# Altium integrated library Integrated_jp.IntLib: 316 symbols (part 1 of 3) (continued)
## CONN_PWR_JACK_2.5X5.5MM (continued)
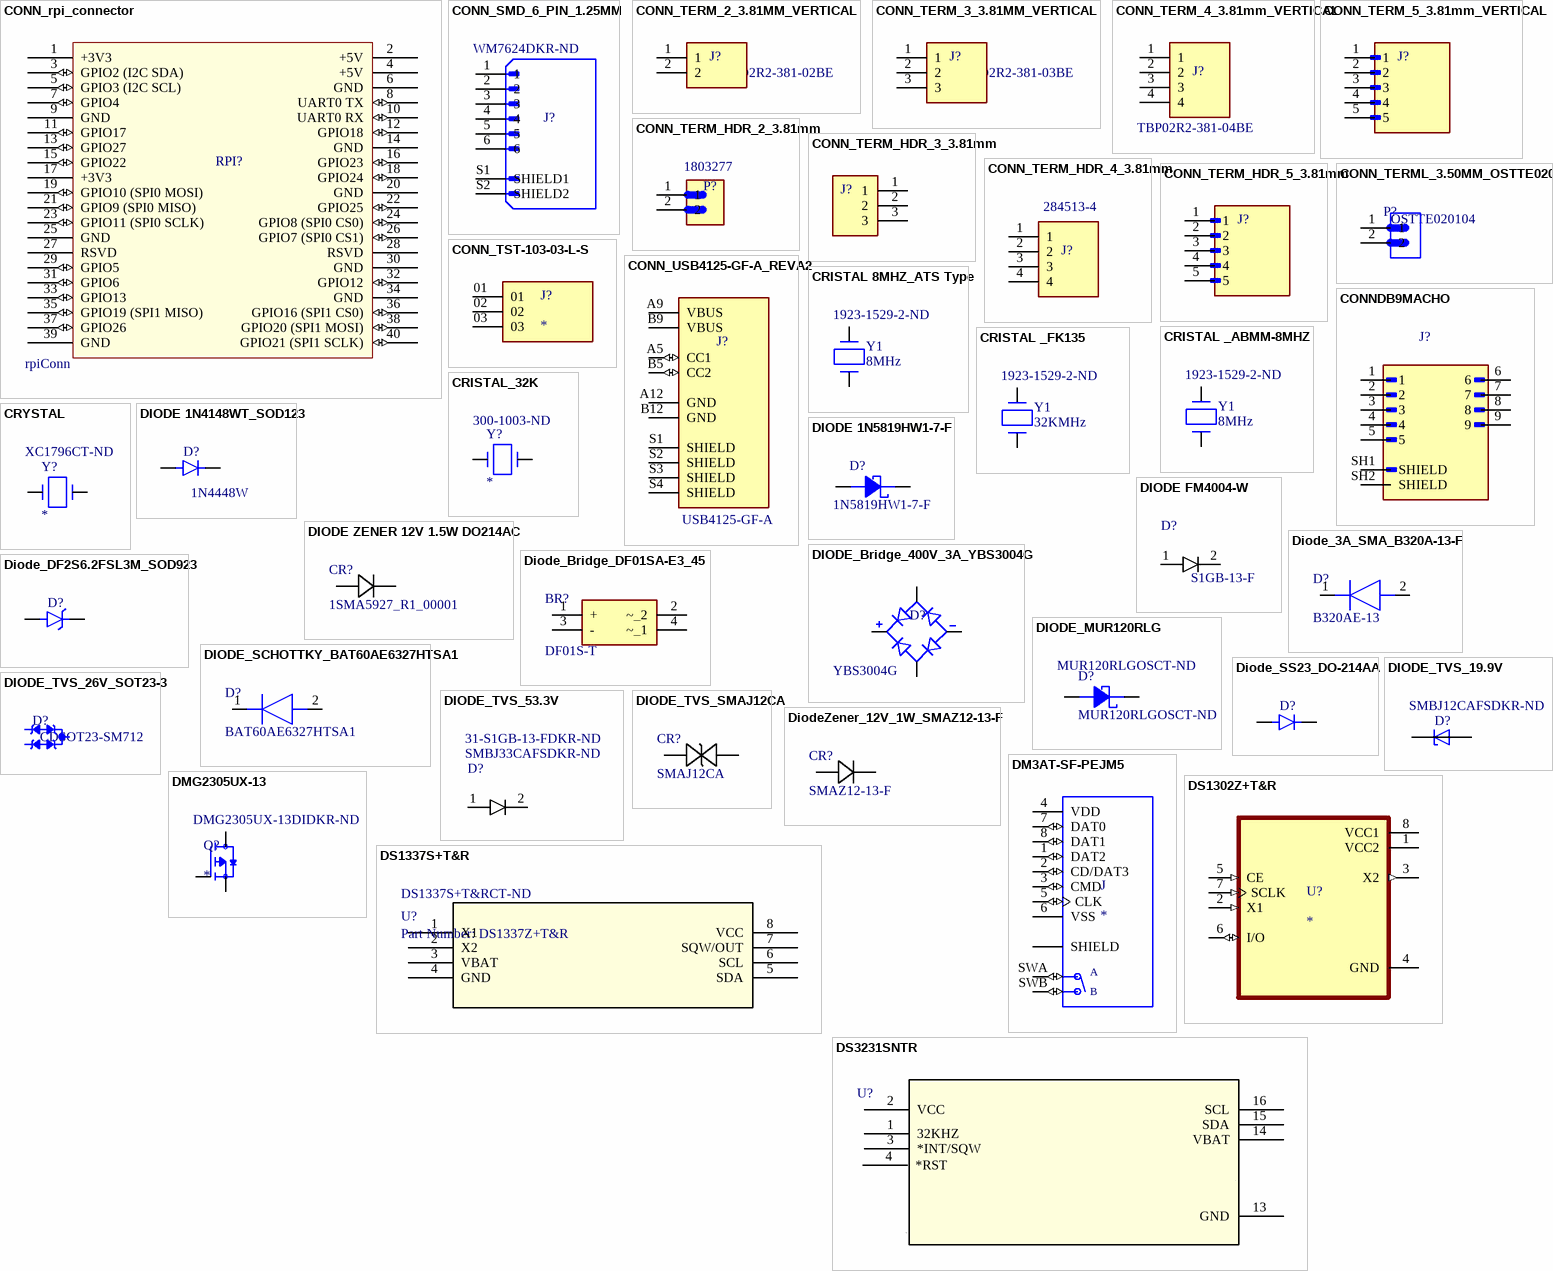
[diagram p2: symbols CONN_rpi_connector to DS3231SNTR]

## CONN_rpi_connector
designator RPI?, comment value rpiConn  (hidden comment: ESQ-120-14-T-D)
40 Position Elevated Socket Connector 0.100" (2.54mm) Through Hole Tin; Digi_Key_Part_Number: SAM11108-ND; Link: https://www.digikey.com/en/products/detail/samtec-inc/ESQ-120-14-T-D/6693975; Price: 5,84; ComponentLink1Description: CONN SOCKET 40POS 0.1 TIN PCB; ComponentLink1URL: https://www.digikey.com/en/products/detail/samtec-inc/ESQ-120-14-T-D/6693975
footprint SAMTEC_ESQ-120-XX-X-D-XX
pins: 1 +3V3 (power), 2 +5V (power), 3 GPIO2 (I2C SDA) (io), 4 +5V (power), 5 GPIO3 (I2C SCL) (io), 6 GND (power), 7 GPIO4 (io), 8 UART0 TX (io), 9 GND (power), 10 UART0 RX (io), 11 GPIO17 (io), 12 GPIO18 (io), 13 GPIO27 (io), 14 GND (power), 15 GPIO22 (io), 16 GPIO23 (io), 17 +3V3 (power), 18 GPIO24 (io), 19 GPIO10 (SPI0 MOSI) (io), 20 GND (power), 21 GPIO9 (SPI0 MISO) (io), 22 GPIO25 (io), 23 GPIO11 (SPI0 SCLK) (io), 24 GPIO8 (SPI0 CS0) (io), 25 GND (power), 26 GPIO7 (SPI0 CS1) (io), 27 RSVD, 28 RSVD, 29 GPIO5 (io), 30 GND (power), 31 GPIO6 (io), 32 GPIO12 (io), 33 GPIO13 (io), 34 GND, 35 GPIO19 (SPI1 MISO) (io), 36 GPIO16 (SPI1 CS0) (io), 37 GPIO26 (io), 38 GPIO20 (SPI1 MOSI) (io), 39 GND (power), 40 GPIO21 (SPI1 SCLK) (io)

## CONN_SMD_6_PIN_1.25MM
designator J?, comment Supplier Part Number 1: WM7624DKR-ND  (hidden comment: 532610671)
Connector Header Surface Mount, Right Angle 6 position 0.049 (1.25mm); MF: Molex; Check_prices: https://www.snapeda.com/parts/532610671/Molex/view-part/?ref=eda; Value: *; Purchase-URL: https://pricing.snapeda.com/search/part/532610671/?ref=eda; Digi-Key_Part_Number: WM7624TR-ND; SnapEDA_Link: https://www.snapeda.com/parts/532610671/Molex/view-part/?ref=snap; Package: None; MP: 532610671; Supplier 1: Digi-Key; ComponentLink1Description: CONN HEADER SMD R/A 6POS 1.25MM; ComponentLink1URL: https://www.digikey.com/es/products/detail/0532610671/WM7624DKR-ND/1846792?utm_campaign=buynow&utm_medium=aggregator&curr=usd&utm_source=octopart; Link: https://www.digikey.com/es/products/detail/0532610671/WM7624DKR-ND/1846792?utm_campaign=buynow&utm_medium=aggregator&curr=usd&utm_source=octopart
footprint MOLEX_532610671
pins: 1, 2, 3, 4, 5, 6, S1 SHIELD1, S2 SHIELD2

## CONN_TERM_2_3.81MM_VERTICAL
designator J?, comment TBP02R2-381-02BE
2 Bloque de terminales de posición Cabecera, clavija macho, protegida (4 lados) 0.150" (3.81mm) Vertical Orificio pasante; Digi_Key_Part_Number: 102-6492-ND; Price: 0,61; ComponentLink1Description: TERMINAL BLOCK, PLUGGABLE, 3.81,; ComponentLink1URL: https://www.digikey.com/es/products/detail/same-sky-formerly-cui-devices/TBP02R2-381-02BE/10238469; Link: https://www.digikey.com/es/products/detail/same-sky-formerly-cui-devices/TBP02R2-381-02BE/10238469; LCSC Part: C8396; Price JLCPCB: 0,02; Value: TBP02R2-381-02BE
footprint SHDR2W80P0X381_1X2_841X720X920P
pins: 1, 2

## CONN_TERM_3_3.81MM_VERTICAL
designator J?, comment TBP02R2-381-03BE
3 Bloque de terminales de posición Cabecera, clavija macho, protegida (4 lados) 0.150" (3.81mm) Vertical Orificio pasante; Digi_Key_Part_Number: 102-6493-ND; Price: 0,74; ComponentLink1Description: TERMINAL BLOCK, PLUGGABLE, 3.81,VERTICAL; ComponentLink1URL: https://www.digikey.com/es/products/detail/same-sky-formerly-cui-devices/TBP02R2-381-03BE/10238470; Link: https://www.digikey.com/es/products/detail/same-sky-formerly-cui-devices/TBP02R2-381-03BE/10238470; LCSC Part: C387814; Price JLCPCB: 0,04; Value: TBP02R2-381-03BE
footprint CUI_TBP02R2-381-03BE
pins: 1, 2, 3

## CONN_TERM_4_3.81mm_VERTICAL
designator J?, comment TBP02R2-381-04BE
4 Bloque de terminales de posición Cabecera, clavija macho, protegida (4 lados) 0.150" (3.81mm) Vertical Orificio pasante; Digi_Key_Part_Number: 102-6494-ND; Price: 0.82; ComponentLink1Description: TERMINAL BLOCK, PLUGGABLE, 3.81,; ComponentLink1URL: https://www.digikey.com/es/products/detail/same-sky-formerly-cui-devices/TBP02R2-381-04BE/10238471; Link: https://www.digikey.com/es/products/detail/same-sky-formerly-cui-devices/TBP02R2-381-04BE/10238471; LCSC Part: C8410; Price JLCPCB: 0,05; Value: TBP02R2-381-04BE
footprint CUI_TBP02R2-381-04BE
pins: 1, 2, 3, 4

## CONN_TERM_5_3.81mm_VERTICAL
designator J?, comment 1803455  (value not drawn)
5 Bloque de terminales de posición Cabecera, clavija macho, protegida (4 lados) 0.150" (3.81mm) Vertical Orificio pasante; Digi_Key_Part_Number: 277-1224-ND; Price: 2,38; Link: https://www.digikey.com/es/products/detail/phoenix-contact/1803455/260592; LCSC Part: C8391; Price JLCPCB: 0,06; ComponentLink1Description: TERM BLOCK HDR 5POS 3.81MM; ComponentLink1URL: https://www.digikey.com/es/products/detail/phoenix-contact/1803455/260592
footprint PHOENIX_1803455
pins: 1, 2, 3, 4, 5

## CONN_TERM_HDR_2_3.81mm
designator P?, comment value 1803277  (hidden comment: 277-1206-ND)
2 Position Terminal Block Header, Male Pins, Shrouded (4 Side) 0.150" (3.81mm) 90°, Right Angle Through Hole; Link: https://www.digikey.com/en/products/detail/phoenix-contact/1803277/260574; ComponentLink1Description: TERM BLOCK HDR 2POS 90DEG 3.81MM; ComponentLink1URL: https://www.digikey.com/es/products/detail/phoenix-contact/1803277/260574?s=N4IgTCBcDa4OxwLQEYwAYBsiByAREAugL5A; Digi_Key_Part_Number: 277-1206-ND; Price: 0,59; LCSC Part: C8387; Price JLCPCB: 0,2
footprint PHOENIX_1803277
pins: 1, 2

## CONN_TERM_HDR_3_3.81mm
designator J?, comment 284513-3  (value not drawn)
3 Bloque de terminales de posición Cabecera, clavija macho, protegida (4 lados) 0.150" (3.81mm) 90°, ángulo recto Orificio pasante; Digi_Key_Part_Number: A98402-ND; Value: 284513-3; Price: 1,31; Link: https://www.digikey.com/en/products/detail/te-connectivity-amp-connectors/284513-3/1153286; ComponentLink1Description: TERM BLOCK HDR 3POS 90DEG 3.81MM; ComponentLink1URL: https://www.digikey.com/es/products/detail/te-connectivity-amp-connectors/284513-3/1153286?s=N4IgTCBcDaIIIE4AcAWADGAtAOQCIgF0BfIA; LCSC Part: C387816; Price JLCPCB: 0,05
footprint TE_284513-3
pins: 1, 2, 3

## CONN_TERM_HDR_4_3.81mm
designator J?, comment 284513-4
4 Bloque de terminales de posición Cabecera, clavija macho, protegida (4 lados) 0.150" (3.81mm) 90°, ángulo recto Orificio pasante; Digi_Key_Part_Number: A98403-ND; Price: 0,79; Link: https://www.digikey.com/en/products/detail/te-connectivity-amp-connectors/284513-4/1136751; ComponentLink1Description: TERM BLOCK HDR 4POS 90DEG 3.81MM; ComponentLink1URL: https://www.digikey.com/es/products/detail/te-connectivity-amp-connectors/284513-4/1136751?s=N4IgTCBcDaIIIE4AcAWADAZgLQDkAiIAugL5A; ComponentLink2Description: TERM BLOCK HDR 4POS 90DEG 3.81MM; ComponentLink2URL: https://www.digikey.com/es/products/detail/te-connectivity-amp-connectors/284513-4/1136751; Price JLCPCB: 0,05; LCSC Part: C7245; Value: 284513-4
footprint TE_284513-4
pins: 1, 2, 3, 4

## CONN_TERM_HDR_5_3.81mm
designator J?, comment 1803303  (value not drawn)
5 Bloque de terminales de posición Cabecera, clavija macho, protegida (4 lados) 0.150" (3.81mm) 90°, ángulo recto Orificio pasante; Digi_Key_Part_Number: 277-1209-ND; Price: 2,38; Link: https://www.digikey.com/es/products/detail/phoenix-contact/1803303/260577; ComponentLink1Description: TERM BLOCK HDR 5POS 3.81MM; ComponentLink1URL: https://www.digikey.com/es/products/detail/phoenix-contact/1803303/260577; LCSC Part: C8395; Price JLCPCB: 0,06
footprint CONN_1803303_PXC
pins: 1, 2, 3, 4, 5

## CONN_TERML_3.50MM_OSTTE020104
designator P?, comment OSTTE020104
2 Bloques de terminales - Cable a placa Horizontal con placa 0.138" (3.50mm) Orificio pasante; Link: https://www.digikey.com/product-detail/en/on-shore-technology-inc/OSTTE020104/ED2740-ND/2351816?utm_source=snapeda&utm_medium=aggregator&utm_campaign=symbol; Price: 0,79; Digi-Key_Part_Number: ED2740-ND; ComponentLink1Description: TERM BLK 2POS SIDE ENT 3.5MM PCB; ComponentLink1URL: https://www.digikey.com/es/products/detail/on-shore-technology-inc/OSTTE020104/2351816; Value: OSTTE020104
footprint OST_OSTTE020104
pins: 1, 2

## CONN_TST-103-03-L-S
designator J?
Cabezal de conector Orificio pasante 3 posiciones 0.100" (2.54mm); MP: TST-103-03-L-S; Package: None; Price: None; Value: *; Availability: Unavailable; ComponentLink1Description: CONN HEADER VERT 3POS 2.54MM; ComponentLink1URL: https://www.digikey.com/es/products/detail/samtec-inc/TST-103-03-L-S/9497032?s=N4IgTCBcDaICoGU4FoCMAGAzMryAyyCIAugL5A; Link: https://www.digikey.com/es/products/detail/samtec-inc/TST-103-03-L-S/9497032?s=N4IgTCBcDaICoGU4FoCMAGAzMryAyyCIAugL5A; Digi-Key_Part_Number: TST-103-03-L-S-ND
footprint SAMTEC_TST-103-03-L-S
pins: 01, 02, 03

## CONN_USB4125-GF-A_REVA2
designator J?, comment USB4125-GF-A
USB-C (USB TYPE-C) Receptacle Connector 24 (6+18 Dummy) Position Surface Mount, Right Angle; Through Hole; Digi_Key_Part_Number: 2073-USB4125-GF-ACT-ND; Link: https://www.digikey.com/en/products/detail/gct/USB4125-GF-A/13547388; Price: 0,80; ComponentLink1Description: CONN RCPT TYPE C 6P SMD RA; ComponentLink1URL: https://www.digikey.com/en/products/detail/gct/USB4125-GF-A/13547388; Value: USB4125-GF-A
footprint GCT_USB4125-GF-A_REVA2
pins: A5 CC1 (io), A9 VBUS (power), A12 GND (power), B5 CC2 (io), B9 VBUS (power), B12 GND (power), S1 SHIELD, S2 SHIELD, S3 SHIELD, S4 SHIELD

## CONNDB9MACHO
designator J?, comment AE10968-ND  (value not drawn)
9 Posiciones D-Sub Clavija de conexión, clavijas macho Conector; Value: A-DS 09 A/KG-T2S; Price: 0,83; Link: https://www.digikey.com/es/products/detail/assmann-wsw-components/A-DS-09-A-KG-T2S/1241804?s=N4IgTCBcDaIIIFECMAGAnANgBwFoByAIiALoC%2BQA; Digi_Key_Part_Number: AE10968-ND; LCSC Part: C9900006534; Mouser Part: *; Price JLCPCB: 0,1; ComponentLink1Description: CONN D-SUB PLUG 9POS R/A SOLDER; ComponentLink1URL: https://www.digikey.com/es/products/detail/assmann-wsw-components/A-DS-09-A-KG-T2S/1241804?s=N4IgTCBcDaIIIFECMAGAnANgBwFoByAIiALoC%2BQA
footprint ASSMANN_A-DS_09_A_KG-T2S
pins: 1, 2, 3, 4, 5, 6, 7, 8, 9, SH1 SHIELD, SH2 SHIELD

## CRISTAL 8MHZ_ATS Type
designator Y1, comment 8MHz  Supplier Part Number 1: 1923-1529-2-ND
ATS Type Crystal; ComponentLink1Description: LFXTAL036274REEL; ComponentLink1URL: https://www.digikey.com/es/products/detail/iqd-frequency-products/LFXTAL036274REEL/8633816; Supplier 1: Digi-Key
footprint OSC-ATS Type (ATS Type Crystal)
pins: 1, 2

## CRISTAL _ABMM-8MHZ
designator Y1, comment 8MHz  Supplier Part Number 1: 1923-1529-2-ND
8 MHz ±20ppm Cristales 18pF 4-SMD, sin conductor; ComponentLink1Description: LFXTAL036274REEL; ComponentLink1URL: https://www.digikey.com/es/products/detail/iqd-frequency-products/LFXTAL036274REEL/8633816; Supplier 1: Digi-Key
footprint OSC_ABMM-8.000MHZ-B2-T
pins: 1, 2

## CRISTAL _FK135
designator Y1, comment 32KMHz  Supplier Part Number 1: 1923-1529-2-ND
CRYSTAL 32.7680KHZ 12.5PF SMD; ComponentLink1Description: LFXTAL036274REEL; ComponentLink1URL: https://www.digikey.com/es/products/detail/iqd-frequency-products/LFXTAL036274REEL/8633816; Supplier 1: Digi-Key
footprint CRYSTAL_0805
pins: 1, 2

## CRISTAL_32K
designator Y?  Supplier Part Number 2: 300-1003-ND
Manufacturer: ECS International; Manufacturer Part Number: ECS-200-20-3X-EN-TR; Frequency: 20MHz; Frequency Tolerance: 30ppm; Load Capacitance: 20pF; ESR (Equivalent Series Resistance): 50R; Frequency Stability: 50ppm; Supplier 1: Digi-Key; Stock 1: 16745; Pricing 1: 1=0.53, 10=0.44, 50=0.396, 100=0.352, 500=0.3344, 1000=0.2816 (USD); Mount: Surface Mount; Min Operating Temperature: -40°C; Max Operating Temperature: 85°C; Package Quantity: 1; Packaging: Tape and Reel; Tolerance: 30ppm; Termination: SMD/SMT; Length: 0.276inch; Height: 0.091inch; Width: 0.161inch; Lead Free: Lead Free; Supplier 2: Digi-Key; Stock 2: 1865; Pricing 2: 1=1.04, 10=0.92, 50=0.86, 100=0.76, 500=0.72, 1000=0.6, 2500=0.58, 5000=0.56, 10000=0.54 (USD); Case/Package: Radial
footprint OSC-CH206-RA
pins: 1, 2

## CRYSTAL
designator Y?  Supplier Part Number 1: XC1796CT-ND
Manufacturer: ECS International; Manufacturer Part Number: ECS-200-20-3X-EN-TR; Frequency: 20MHz; Frequency Tolerance: 30ppm; Load Capacitance: 20pF; ESR (Equivalent Series Resistance): 50R; Frequency Stability: 50ppm; Supplier 1: Digi-Key; Stock 1: 16745; Pricing 1: 1=0.53, 10=0.44, 50=0.396, 100=0.352, 500=0.3344, 1000=0.2816 (USD); Mount: Surface Mount; Min Operating Temperature: -40°C; Max Operating Temperature: 85°C; Package Quantity: 1; Packaging: Tape and Reel; Tolerance: 30ppm; Termination: SMD/SMT; Length: 0.276inch; Height: 0.091inch; Width: 0.161inch; Lead Free: Lead Free; ComponentLink1URL: http://www.ecsxtal.com/store/pdf/CSM-3X.pdf?src-supplier=Digi-Key; ComponentLink1Description: http://www.ecsxtal.com/store/pdf/CSM-3X.pdf?src-supplier=Digi-Key; ComponentLink2Description: ABLS7M2-25.000MHZ-D2Y-T; ComponentLink2URL: https://www.digikey.com/es/products/detail/abracon-llc/ABLS7M2-25-000MHZ-D2Y-T/5135064
footprint XTAL
pins: 1, 2

## DIODE 1N4148WT_SOD123
designator D?, comment value 1N4448W  (hidden comment: 1N4448W-FDICT-ND)
Diodos 75 V 250mA Montaje en superficie SOD-123; Digi_Key_Part_Number: 1N4448W-FDICT-ND; Link: https://www.digikey.com/es/products/detail/micro-commercial-co/1N4448W-TP/789330; ComponentLink2Description: DIODE GEN PURP 75V 250MA SOD123; ComponentLink2URL: https://www.digikey.com/es/products/detail/micro-commercial-co/1N4448W-TP/789330?s=N4IgTCBcDaIIwDkAsKAcB1AKgBQLIGUBhTAWgQBEQBdAXyA; Price: 0,11; LCSC Part: C124191; Mouser Part: 621-1N4448W-F; Price JLCPCB: 0,02
footprint DIOMELF3414N
pins: A 2, C 1

## DIODE 1N5819HW1-7-F
designator D?, comment value 1N5819HW1-7-F  (hidden comment: 1N5819HW1-7-FDICT-ND)
Diode Super Barrier 40 V 1A Surface Mount SOD-123F; Manufacturer: Diodes; Manufacturer Part Number: 1N5819HW-7-F; Forward Voltage: 450mV; Max Power Dissipation: 450mW; Peak Reverse Current: 50uA; Element Configuration: Single; Max Repetitive Reverse Voltage (Vrrm): 40V; Max Forward Surge Current (Ifsm): 25A; Polarity: Standard; Capacitance: 110pF; Case/Package: SOD-123-2; Number of Pins: 2; Weight: 0.000353oz; Contact Plating: Tin,Matte; Min Operating Temperature: -65°C; Max Operating Temperature: 125°C; Package Quantity: 3000; Forward Current: 1A; Packaging: Tape and Reel; Average Rectified Current: 1A; Peak Non-Repetitive Surge Current: 25A; Termination: SMD/SMT; Voltage Rating (DC): 40V; Current Rating: 1A; Output Current: 1A; Max Reverse Voltage (DC): 40V; Length: 2.85mm; Height: 1.25mm; Width: 1.7mm; Radiation Hardening: No; REACH SVHC: No SVHC; Lead Free: Lead Free; Supplier 1: Digi-Key; Digi_Key_Part_Number: 1N5819HW1-7-FDICT-ND; Link: https://www.digikey.com/en/products/detail/diodes-incorporated/1n5819hw1-7-f/5768523; ComponentLink7Description: DIODE SBR 40V 1A SOD123F; ComponentLink7URL: https://www.digikey.com/es/products/detail/diodes-incorporated/1N5819HW1-7-F/5768523?s=N4IgTCBcDaIIwDkCsAOOBOAEgdTgWgHY8AxAEQEkBhAFTwVJAF0BfIA; Supplier Part Number 1: 1N5819HW1-7-FDIDKR-ND; Price: 0,46
footprint DIODE DO-214AC
pins: 1, 2

## DIODE FM4004-W
designator D?, comment value S1GB-13-F  (hidden comment: 31-S1GB-13-FCT-ND)
Diodos 400 V 1A Montaje en superficie SMB; Manufacturer: ON Semiconductor / Fairchild; MF: ON Semiconductor; MP: 1N4007; Forward Voltage: 1.1V; Polarity: Standard; Peak Non-Repetitive Surge Current: 30A; Element Configuration: Single; Voltage Rating (DC): 1kV; Capacitance: 15pF; Peak Reverse Current: 5uA; Power Dissipation: 3W; Price: 0,25; Package: DO-41 Good-Ark; Availability: Unavailable; SnapEDA_Link: https://www.snapeda.com/parts/1N4007/ON%20Semiconductor/view-part/?ref=snap; Manufacturer Part Number: 1N4007; Mount: Through Hole; Number of Pins: 2; Weight: 0.245g; Contact Plating: Tin,Matte; Min Operating Temperature: -65°C; Max Operating Temperature: 175°C; Packaging: Tape and Reel; Current Rating: 1A; Output Current: 1A; Max Surge Current: 30A; Forward Current: 1A; Max Repetitive Reverse Voltage (Vrrm): 1kV; Max Forward Surge Current (Ifsm): 30A; Package Quantity: 1000; Reverse Voltage: 1kV; Average Rectified Current: 1A; Max Reverse Voltage (DC): 1kV; Diameter: 2.72mm; Length: 5.2mm; Height: 5.2mm; Width: 2.72mm; Radiation Hardening: No; REACH SVHC: No SVHC; Lead Free: Lead Free; Supplier 1: Digi-Key; ComponentLink4Description: DIODE GEN PURP 400V 1A SMB; ComponentLink4URL: https://www.digikey.com/es/products/detail/diodes-incorporated/S1GB-13-F/814409?s=N4IgTCBcDaIMwEYC0BlBBxAQkhckDEBhAFSQDkAREAXQF8g; Link: https://www.digikey.com/es/products/detail/diodes-incorporated/S1GB-13-F/814409?s=N4IgTCBcDaIMwEYC0BlBBxAQkhckDEBhAFSQDkAREAXQF8g; Digi_Key_Part_Number: 31-S1GB-13-FCT-ND; Supplier Part Number 1: 2516-FM4004W-WTR-ND
footprint DIODE DO-214AC
pins: 1, 2

## DIODE ZENER 12V 1.5W DO214AC
designator CR?, comment 1SMA5927_R1_00001
Diodo - Zener 12 V 1.5 W ±5% Montaje en superficie DO-214AC (SMA); Digi_Key_Part_Number: 3757-1SMA5927_R1_00001CT-ND; Link: https://www.digikey.com/es/products/detail/panjit-international-inc/1SMA5927-R1-00001/15801773; Price: 0,23; JLCPCB Part: C313128; ComponentLink1Description: DIODE ZENER 12V 1.5W DO214AC; ComponentLink1URL: https://www.digikey.com/es/products/detail/panjit-international-inc/1SMA5927-R1-00001/15801773; Value: 1SMA5927_R1_00001
footprint SMA_DIO-M
pins: 1 K, 2 A

## Diode_3A_SMA_B320A-13-F
designator D?, comment B320AE-13
Diodos 20 V 3A Montaje en superficie SMA; Digi_Key_Part_Number: B320AE-13DICT-ND; ComponentLink1Description: DIODE SCHOTTKY 20V 3A SMA; ComponentLink1URL: https://www.digikey.com/es/products/detail/diodes-incorporated/B320AE-13/8545849; Link: https://www.digikey.com/es/products/detail/diodes-incorporated/B320AE-13/8545849; Price: 0,26; LCSC Part: C110484; Mouser Part: 621-B320AE-13; Price JLCPCB: 0,09; Value: B320AE-13
footprint DIOM5226X230N
pins: 1 K, 2 A

## DIODE_Bridge_400V_3A_YBS3004G
designator D?, comment YBS3004G
Rectificador de puente Single Phase Estándar 400 V Montaje en superficie YBS; Digi_Key_Part_Number: YBS3004GCT-ND; Price: 0,73; ComponentLink1Description: BRIDGE RECT 1PHASE 400V 3A YBS; ComponentLink1URL: https://www.digikey.com/es/products/detail/taiwan-semiconductor-corporation/YBS3004G/9603222?s=N4IgTCBcDaIJoCEDKBmADGgLAcQMIBUBaAOQBEQBdAXyA; Link: https://www.digikey.com/es/products/detail/taiwan-semiconductor-corporation/YBS3004G/9603222?s=N4IgTCBcDaIJoCEDKBmADGgLAcQMIBUBaAOQBEQBdAXyA; LCSC Part: C393522; Price JLCPCB: 0,11; Mouser Part: 821-YBS3004G; Value: YBS3004G
footprint DIOB_YBS3004G
pins: 1 POS, 2 NEG, 3 AC1, 4 AC2

## Diode_Bridge_DF01SA-E3_45
designator BR?, comment DF01S-T
Rectificador de puente Single Phase Estándar 100 V Montaje en superficie DF-S; Digi_Key_Part_Number: DF01S-TDICT-ND; ComponentLink1Description: BRIDGE RECT 1PHASE 100V 1A DF-S; ComponentLink1URL: https://www.digikey.com/es/products/detail/diodes-incorporated/DF01S-T/1934939; Link: https://www.digikey.com/es/products/detail/diodes-incorporated/DF01S-T/1934939; Price: 0,61; JLCPCB Part: C110491; Value: DF01S-T
footprint SOP510P1005X363-4N
pins: 1 +, 2 ~_2, 3 -, 4 ~_1

## Diode_DF2S6.2FSL3M_SOD923
designator D?
TVS DIODE 5VWM SOD923; MF: ON Semiconductor; MP: ESD9X5.0ST5G; Availability: Unavailable; Value: *; Package: SOD-923 ON Semiconductor; Price: None; SnapEDA_Link: https://www.snapeda.com/parts/ESD9X5.0ST5G/ON%20Semiconductor/view-part/237761/?ref=snap
footprint SODFL1006X43N
pins: A, C K

## DIODE_MUR120RLG
designator D?, comment MUR120RLGOSCT-ND
Diodos 200 V 1A Orificio pasante Axial; Manufacturer: Diodes; Manufacturer Part Number: 1N5819HW-7-F; Forward Voltage: 450mV; Max Power Dissipation: 450mW; Peak Reverse Current: 50uA; Element Configuration: Single; Max Repetitive Reverse Voltage (Vrrm): 40V; Max Forward Surge Current (Ifsm): 25A; Polarity: Standard; Capacitance: 110pF; Max Surge Current: 35A; Recovery Time: 35ns; Reverse Voltage: 200V; Natural Thermal Resistance: 87°C/W; Supplier 1: Digi-Key; Stock 1: 378269; Pricing 1: 1=0.45, 10=0.333, 100=0.1884, 500=0.1248, 1000=0.09568 (USD); Case/Package: SOD-123-2; Number of Pins: 2; Weight: 0.000353oz; Contact Plating: Tin,Matte; Min Operating Temperature: -65°C; Max Operating Temperature: 125°C; Package Quantity: 3000; Forward Current: 1A; Packaging: Tape and Reel; Average Rectified Current: 1A; Peak Non-Repetitive Surge Current: 25A; Termination: SMD/SMT; Voltage Rating (DC): 40V; Current Rating: 1A; Output Current: 1A; Max Reverse Voltage (DC): 40V; Length: 2.85mm; Height: 1.25mm; Width: 1.7mm; Radiation Hardening: No; REACH SVHC: No SVHC; Lead Free: Lead Free; Supplier 2: Digi-Key; Stock 2: 1733; Pricing 2: 1=0.39, 10=0.29, 100=0.138, 500=0.1223, 1000=0.09518, 2500=0.08709 (USD); Reverse Recovery Time: 35ns; Halogen Free: Halogen Free; ComponentLink1Description: DIODE GEN PURP 200V 1A AXIAL; ComponentLink1URL: https://www.digikey.com/es/products/detail/onsemi/MUR120RLG/919897?s=N4IgTCBcDaILYFcBOBGMAGJAbA5gewGcBjAFwFoA7AExAF0BfIA; Digi_Key_Part_Number: MUR120RLGOSCT-ND; Link: https://www.digikey.com/es/products/detail/onsemi/MUR120RLG/919897?s=N4IgTCBcDaILYFcBOBGMAGJAbA5gewGcBjAFwFoA7AExAF0BfIA#mktPlaceViewSection; Supplier Part Number 2: MUR120RLGOSCT-ND
footprint DIODE1N4007(Primary)
pins: 1, 2

## DIODE_SCHOTTKY_BAT60AE6327HTSA1
designator D?, comment BAT60AE6327HTSA1
DIODE SCHOTTKY 10 V 3A Surface Mount PG-SOD323-2; Manufacturer_Name: Infineon; Digi_Key_Part_Number: BAT60AE6327HTSA1CT-ND; Datasheet Link: https://www.infineon.com/dgdl/Infineon-BAT60ASERIES-DS-v01_01-en.pdf?fileId=db3a304313d846880113def70c9304a9; Height: 1.1mm; Manufacturer_Part_Number: BAT60AE6327HTSA1; Mouser Part Number: 726-BAT60AE6327HTSA1; Mouser Price/Stock: https://www.mouser.co.uk/ProductDetail/Infineon-Technologies/BAT60AE6327HTSA1?qs=OwbwYO03UsIW3Y2lCXbs8Q%3D%3D; Arrow Part Number: BAT60AE6327HTSA1; Arrow Price/Stock: https://www.arrow.com/en/products/bat60ae6327htsa1/infineon-technologies-ag?region=nac; ComponentLink1Description: BAT60AE6327HTSA1; ComponentLink1URL: https://www.digikey.com/en/products/detail/infineon-technologies/BAT60AE6327HTSA1/1557845; Link: https://www.digikey.com/en/products/detail/infineon-technologies/BAT60AE6327HTSA1/1557845; Value: BAT60AE6327HTSA1
footprint SOD2513X110N
pins: 1 K, 2 A

## Diode_SS23_DO-214AA
designator D?, comment SS23B230-FDICT-ND  (value not drawn)
Diode 30 V 2A Surface Mount DO-214AA (SMB); MP: SS23; Value: DIODE SCHOTTKY 30V 2A DO214AA; Availability: Unavailable; Price: None; Package: None; Link: https://www.digikey.com/en/products/detail/diodes-incorporated/B230-13-F/815328; Digi-Key_Part_Number: B230-FDICT-ND; ComponentLink1Description: DIODE SCHOTTKY 30V 2A SMB; ComponentLink1URL: https://www.digikey.com/en/products/detail/diodes-incorporated/B230-13-F/815328
footprint DIOM4336X265N
pins: A, C K

## DIODE_TVS_19.9V
designator D?, comment Supplier Part Number 1: SMBJ12CAFSDKR-ND  (hidden comment: SMBJ12CAFSCT-ND)
19.9V Abrazadera 30.2 A Ipp TVS - Diodos Montaje en superficie DO-214AA (SMB); MF: Taiwan Semiconductor Corporation; MP: SMF18A RQG; Purchase-URL: https://pricing.snapeda.com/search/part/SMF18A RQG/?ref=eda; Price: None; Check_prices: https://www.snapeda.com/parts/SMF18A%20RQG/Taiwan+Semiconductor/view-part/?ref=eda; SnapEDA_Link: https://www.snapeda.com/parts/SMF18A%20RQG/Taiwan+Semiconductor/view-part/?ref=snap; Availability: In Stock; Value: *; Package: None; Supplier 1: Digi-Key; ComponentLink1Description: TVS DIODE 12VWM 19.9VC DO214AA; ComponentLink1URL: https://www.digikey.com/es/products/detail/taiwan-semiconductor-corporation/SMBJ12CA/1050224?s=N4IgTCBcDaIMoFkBCApAjGAwgQQGJ0wBUBaAOQBEQBdAXyA; Link: https://www.digikey.com/es/products/detail/taiwan-semiconductor-corporation/SMBJ12CA/1050224?s=N4IgTCBcDaIMoFkBCApAjGAwgQQGJ0wBUBaAOQBEQBdAXyA; Digi_Key_Part_Number: SMBJ12CAFSCT-ND
footprint SODFL3718X102N
pins: 1 C, 2 A

## DIODE_TVS_26V_SOT23-3
designator D?, comment value CDSOT23-SM712  (hidden comment: CDSOT23-SM712CT-ND)
26V, 14V Abrazadera 17 A (8/20µs) Ipp TVS - Diodos Montaje en superficie SOT-23-3; MF: Bourns; Check_prices: https://www.snapeda.com/parts/CDSOT23-SM712/Bourns+-+J.W.+Miller/view-part/?ref=eda; Availability: In Stock; MP: CDSOT23-SM712; Price: 2,11; Package: SOT-23 Bourns; SnapEDA_Link: https://www.snapeda.com/parts/CDSOT23-SM712/Bourns+-+J.W.+Miller/view-part/?ref=snap; Purchase-URL: https://pricing.snapeda.com/search/part/CDSOT23-SM712/?ref=eda; Supplier 1: Digi-Key; Link: https://www.digikey.com/es/products/detail/CDSOT23-SM712/CDSOT23-SM712DKR-ND/1630622?utm_campaign=buynow&utm_medium=aggregator&curr=usd&utm_source=octopart; Digi_Key_Part_Number: CDSOT23-SM712CT-ND; ComponentLink1Description: TVS DIODE 7V/12V 14V/26V SOT23-3; ComponentLink1URL: https://www.digikey.com/es/products/detail/CDSOT23-SM712/CDSOT23-SM712DKR-ND/1630622?utm_campaign=buynow&utm_medium=aggregator&curr=usd&utm_source=octopart; Supplier Part Number 1: CDSOT23-SM712DKR-ND
footprint SOT23-3
pins: 1 P$1, 2 P$2, 3 P$3

## DIODE_TVS_53.3V
designator D?, comment Supplier Part Number 2: 31-S1GB-13-FDKR-ND  (hidden comment: SMBJ33CAFSDKR-ND)
53.3V Abrazadera 11.3A Ipp TVS - Diodos Montaje en superficie DO-214AA (SMB); Manufacturer: ON Semiconductor / Fairchild; Digi_Key_Part_Number: SMBJ33CAFSCT-ND; MF: ON Semiconductor; MP: 1N4007; Forward Voltage: 1.1V; Polarity: Standard; Peak Non-Repetitive Surge Current: 30A; Element Configuration: Single; Voltage Rating (DC): 1kV; Current Rating: 1A; Capacitance: 15pF; Peak Reverse Current: 5uA; Power Dissipation: 3W; Operating Supply Voltage: 33V; Breakdown Voltage: 36.7V; Number of Channels: 1; Peak Pulse Power: 600W; Price: None; Package: DO-41 Good-Ark; Availability: Unavailable; SnapEDA_Link: https://www.snapeda.com/parts/1N4007/ON%20Semiconductor/view-part/?ref=snap; Value: *; Manufacturer Part Number: 1N4007; Mount: Through Hole; Number of Pins: 2; Weight: 0.245g; Contact Plating: Tin,Matte; Min Operating Temperature: -65°C; Max Operating Temperature: 175°C; Packaging: Tape and Reel; Output Current: 1A; Max Surge Current: 30A; Forward Current: 1A; Max Repetitive Reverse Voltage (Vrrm): 1kV; Max Forward Surge Current (Ifsm): 30A; Package Quantity: 1000; Reverse Voltage: 1kV; Average Rectified Current: 1A; Max Reverse Voltage (DC): 1kV; Diameter: 2.72mm; Length: 5.2mm; Height: 5.2mm; Width: 2.72mm; Radiation Hardening: No; REACH SVHC: No SVHC; Lead Free: Lead Free; Supplier 1: Digi-Key; Stock 1: 77516; Pricing 1: 1=0.4, 10=0.344, 25=0.3208, 100=0.2384, 250=0.22648, 500=0.18614, 1000=0.15129 (USD); Clamping Voltage: 53.3V; Power Rating: 600W; Supplier 2: Digi-Key; ComponentLink1Description: TVS DIODE 33VWM 53.3VC DO214AA; ComponentLink1URL: https://www.digikey.com/es/products/detail/taiwan-semiconductor-corporation/SMBJ33CA/965472?s=N4IgTCBcDaIMoFkBCApAzGgwgQQGJwBEBpAJQFoA5AkAXQF8g; Link: https://www.digikey.com/es/products/detail/taiwan-semiconductor-corporation/SMBJ33CA/965472?s=N4IgTCBcDaIMoFkBCApAzGgwgQQGJwBEBpAJQFoA5AkAXQF8g; Supplier Part Number 1: SMBJ33CAFSDKR-ND
footprint SM/_SMB DIODE
pins: 1, 2

## DIODE_TVS_SMAJ12CA
designator CR?, comment SMAJ12CA
19.9V Clamp 20.1A Ipp Tvs Diode Surface Mount DO-214AC (SMA); Digi_Key_Part_Number: SMAJ12CALFCT-ND; ComponentLink1Description: TVS DIODE 12VWM 19.9VC DO214AC; ComponentLink1URL: https://www.digikey.com/en/products/detail/littelfuse-inc/SMAJ12CA/762271; Link: https://www.digikey.com/en/products/detail/littelfuse-inc/SMAJ12CA/762271; Price: 0,35; LCSC Part: C78399; Mouser Part: 576-SMAJ12CA; Price JLCPCB: 0,04; Value: SMAJ12CA
footprint SMASeries_LTF-L
pins: 1, 2

## DiodeZener_12V_1W_SMAZ12-13-F
designator CR?, comment SMAZ12-13-F
Diodo - Zener 12 V 1 W ±5% Montaje en superficie SMA; Digi_Key_Part_Number: SMAZ12-FDICT-ND; ComponentLink1Description: DIODE ZENER 12V 1W SMA; ComponentLink1URL: https://www.digikey.com/es/products/detail/diodes-incorporated/SMAZ12-13-F/725035; Link: https://www.digikey.com/es/products/detail/diodes-incorporated/SMAZ12-13-F/725035; Price: 0,26; LCSC Part: C110523; Price JLCPCB: 0,10; Mouser Part: 621-SMAZ12-F; Value: SMAZ12-13-F
footprint SMA_DIO-M
pins: 1, 2

## DM3AT-SF-PEJM5
designator J
10ï¼ˆ8 + 2ï¼‰ä½ç½®å¡è¿žæŽ¥å™¨å®‰å…¨æ•°å­—-microSDâ„¢è¡¨é¢å®‰è£…ï¼Œç›´è§’é‡‘; MF: Hirose; MP: DM3AT-SF-PEJM5; Price: None; SnapEDA_Link: https://www.snapeda.com/parts/DM3AT-SF-PEJM5/Hirose%20Electric%20Co%20Ltd/view-part/1223877/?ref=snap; Availability: Unavailable; Package: None; Value: *
footprint HRS_DM3AT-SF-PEJM5
pins: 1 DAT2 (io), 2 CD/DAT3 (io), 3 CMD (io), 4 VDD (power), 5 CLK (io), 6 VSS (power), 7 DAT0 (io), 8 DAT1 (io), P1 SHIELD, P2 SHIELD, P3 SHIELD, P4 SHIELD, SWA A (io), SWB B (io)

## DMG2305UX-13
designator Q?  Supplier Part Number 1: DMG2305UX-13DIDKR-ND
P-Channel 20V 4.2A _Ta_ 1.4W _Ta_ Surface Mount SOT-23; MP: DMG2305UX-13; MF: Diodes Inc.; Package: SOT-23-3 Diodes Inc.; Price: None; Availability: Unavailable; Value: *; SnapEDA_Link: https://www.snapeda.com/parts/DMG2305UX-13/Diodes%20Inc./view-part/100092/?ref=snap; Supplier 1: Digi-Key
footprint SOT91P240X110-3N
pins: 1 G, 2 S, 3 D

## DS1302Z+T&R
designator U?
Real Time Clock _RTC_ IC Clock/Calendar 31B 3-Wire Serial 8-SOIC _0.154, 3.90mm Width_; MF: Maxim Integrated; Value: DS1302Z+T&R; Package: SOIC-8 Maxim Integrated; Availability: Unavailable; MP: DS1302Z+T&R; SnapEDA_Link: https://www.snapeda.com/parts/DS1302Z/Maxim%20Integrated/view-part/2748183/?ref=snap; Price: None; ComponentLink1Description: DS1302Z+T&R; ComponentLink1URL: https://www.digikey.com/en/products/detail/analog-devices-inc-maxim-integrated/DS1302Z-T-R/1017846; Link: https://www.digikey.com/en/products/detail/analog-devices-inc-maxim-integrated/DS1302Z-T-R/1017846; Digi-Key_Part_Number: DS1302Z+CT-ND
footprint SOIC127P600X175-8N
pins: 1 VCC2 (power), 2 X1 (in), 3 X2 (out), 4 GND (power), 5 CE (in), 6 I/O (io), 7 SCLK (in), 8 VCC1 (power)

## DS1337S+T&R
designator U?, comment Part Number: DS1337Z+T&R  Supplier Part Number 1: DS1337S+T&RCT-ND
Relojes de tiempo real (RTC) IC Reloj/calendario - I²C, 2 conductores en serie 8-SOIC (ancho 0.154", 3.90mm; Manufacturer_Part_Number: DS1307Z+T&R; Manufacturer: Maxim Dallas; Vendor: Maxim Integrated Products; Built_By: EMA_UL_Team; Max Supply Voltage: 5.5V; Min Supply Voltage: 4.5V; Memory Size: 56B; Time Format: HH:MM:SS; Copyright: Copyright (C) 2018 Accelerated Designs. All rights reserved; RefDes: RefDes; Type: DEV; Value: Value; Manufacturer Part Number: DS1307Z+T&R; Mount: Surface Mount; Case/Package: SOIC; Number of Pins: 8; Min Operating Temperature: 0°C; Max Operating Temperature: 70°C; Packaging: Tape and Reel; Length: 5mm; Height: 1.5mm; Width: 4mm; Lead Free: Lead Free; Supplier 1: Digi-Key
footprint 21-0041B_8-M
pins: 1 X1, 2 X2, 3 VBAT (power), 4 GND (power), 5 SDA, 6 SCL, 7 SQW/OUT, 8 VCC (power)

## DS3231SNTR
designator U?, comment DS3231SN#T&R  (value not drawn)
Real Time Clock (RTC) IC Clock/Calendar I2C, 2-Wire Serial 16-SOIC (0.295", 7.50mm Width); Digi_Key_Part_Number: DS3231SN#T&RCT-ND; Link: https://www.digikey.com/en/products/detail/analog-devices-inc-maxim-integrated/DS3231SN-T-R/1197577; Value: DS3231SN#T&R; ComponentLink1Description: IC RTC CLK/CALENDAR I2C 16SOIC; ComponentLink1URL: https://www.digikey.com/en/products/detail/analog-devices-inc-maxim-integrated/DS3231SN-T-R/1197577; Price: 12,88; LCSC Part: C9866; Mouser Part: 700-DS3231SN#T&R-; Price JLCPCB: 3,15
footprint 21-0042B_16_MXM-L
pins: 1 32KHZ, 2 VCC (power), 3 *INT/SQW, 4 *RST, 5 NC, 6 NC, 7 NC, 8 NC, 9 NC, 10 NC, 11 NC, 12 NC, 13 GND (power), 14 VBAT (power), 15 SDA, 16 SCL
